# Altium footprint library 7Robot.PcbLib: 67 footprints (part 4 of 5)
Each footprint in its own frame and in the unit in brackets; x right, y up, seen from the top. Pads: shape width x height; smd on the part's side, far side on the other; paste and mask are expansions set on the pad; w line width, h text height; cw(c..) or ccw(c..) is an arc to the next point about the centre after c.
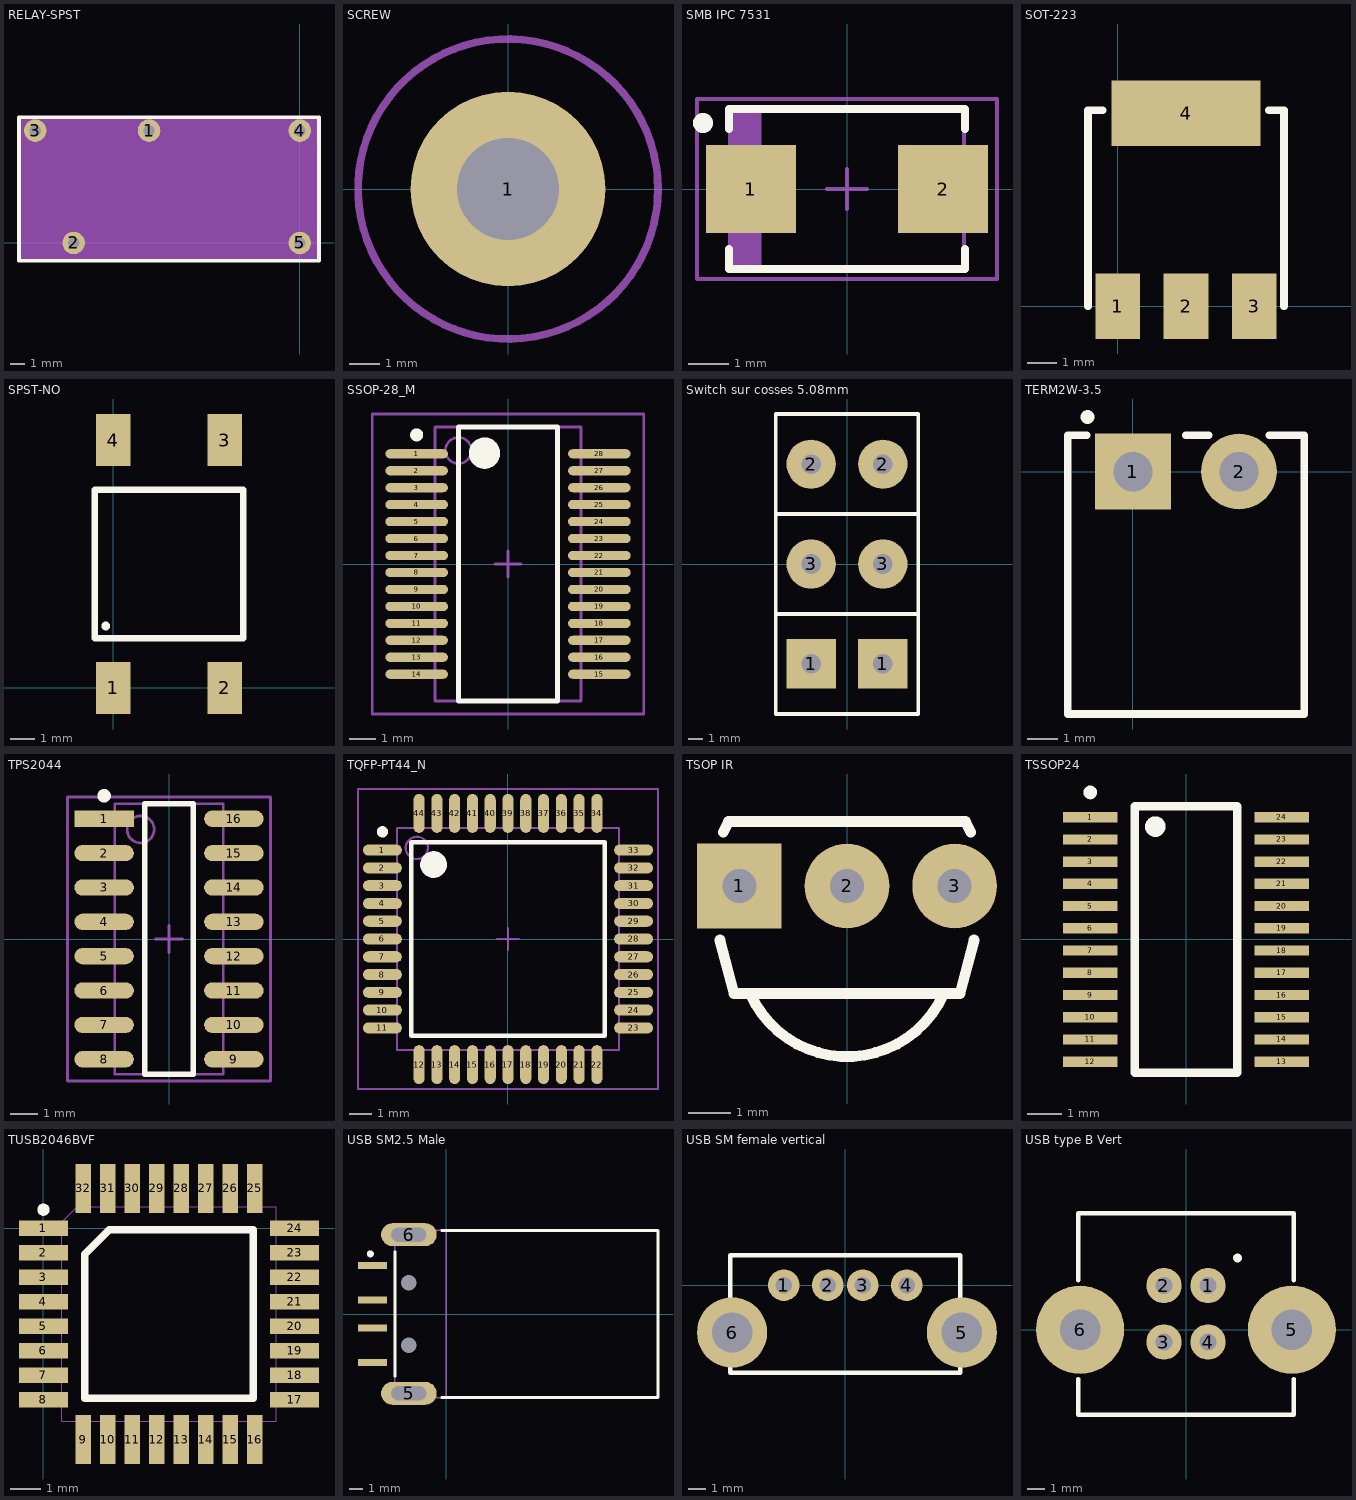
[diagram p3: the footprints below, top view; thin cyan lines are the x and y axes]

## RELAY-SPST [mil]
height 590.55
pads (5):
  round 60 hole 30: 1(-401.57,299.21) 2(-602.36,0) 3(-704.72,299.21) 4(0,299.21) 5(0,0)
Top Overlay:
  lines w10: -748.03,-47.24 51.18,-47.24 51.18,334.65 -748.03,334.65 -748.03,-47.24
Mechanical 1:
  rectangle: -748.03,-47.24 51.18,334.65

## SCREW [mm] "Mounting Hole M3"
height 10
pads (1):
  round 6.5 hole 3.4: 1(0,0)
Mechanical 1:
  circle w0.254: c0,0 r5
3D body: height -0.8, standoff -3.8, extent -2.886,-2.523 2.886,2.524
3D body: height 10, standoff -8.18, extent -2.886,-2.523 2.887,2.524

## SMB IPC 7531 [mm] "Molded Diode, 2-Leads, Body 5,8x3,6mm, IPC Medium Density"
height 2.45
pads (2):
  rect 2.25x2.2 smd: 1(-2.4,0) 2(2.4,0)
Top Overlay:
  circle w0.25: c-3.6,1.65 r0.125
  lines w0.2: -2.95,-1.5 -2.95,-2 2.95,-2 2.95,-1.5 ; -2.95,1.5 -2.95,2 2.95,2 2.95,1.5
Mechanical 13:
  rectangle: -2.92,-1.975 -2.135,1.975
  lines w0.1: -2.92,-1.975 -2.92,1.975 2.92,1.975 2.92,-1.975 -2.92,-1.975
Mechanical 15:
  lines w0.1: -0.5,0 0.5,0 ; 0,-0.5 0,0.5 ; -3.75,-2.25 -3.75,2.25 3.75,2.25 3.75,-2.25 -3.75,-2.25
3D body: height 2.45, standoff 0, extent -2.92,-1.975 2.92,1.975

## SOT-223 [mm] "Surface mounted, 4 pin package"
pads (4):
  rect 1.5x2.2 smd: 1(0,0) 2(2.3,0) 3(4.6,0)
  rect 5x2.2 smd: 4(2.3,6.5)
Top Overlay:
  lines w0.254: -1,0 -1,6.604 -0.508,6.604 ; 5.08,6.604 5.6,6.604 5.6,0
3D body: height 1.64, standoff -0.01, extent -0.95,-0.198 5.55,6.802

## SPST-NO [mm] "Tactile Switch SPST-NO 6x6mm"
height 6
pads (4):
  rect 1.4x2.1 smd: 1(0,0) 2(4.5,0) 3(4.5,10) 4(0,10)
Top Overlay:
  circle w0.254: c-0.3,2.5 r0.05
  lines w0.254: -0.75,2 5.25,2 5.25,8 -0.75,8 -0.75,2
3D body: height 5, standoff -0.05, extent -0.75,0.925 5.25,9.075

## SSOP-28_M [mm] "SOP, 28-Leads, Body 10.2x5.3mm, Pitch 0.65mm, IPC Low Density"
height 2
pads (28):
  oval 2.4x0.35 smd: 1(-3.5,4.225) 2(-3.5,3.575) 3(-3.5,2.925) 4(-3.5,2.275) 5(-3.5,1.625) 6(-3.5,0.975) 7(-3.5,0.325) 8(-3.5,-0.325) 9(-3.5,-0.975) 10(-3.5,-1.625) 11(-3.5,-2.275) 12(-3.5,-2.925) 13(-3.5,-3.575) 14(-3.5,-4.225) 15(3.5,-4.225) 16(3.5,-3.575) 17(3.5,-2.925) 18(3.5,-2.275) 19(3.5,-1.625) 20(3.5,-0.975) 21(3.5,-0.325) 22(3.5,0.325) 23(3.5,0.975) 24(3.5,1.625) 25(3.5,2.275) 26(3.5,2.925) 27(3.5,3.575) 28(3.5,4.225)
Top Overlay:
  circle w0.25: c-3.5,4.95 r0.125
  circle w0.6: c-0.9,4.25 r0.3
  lines w0.2: -1.9,-5.25 -1.9,5.25 1.9,5.25 1.9,-5.25 -1.9,-5.25
Mechanical 13:
  circle w0.1: c-1.9,4.35 r0.5
  lines w0.1: -2.8,-5.25 -2.8,5.25 2.8,5.25 2.8,-5.25 -2.8,-5.25
Mechanical 15:
  lines w0.1: -0.5,0 0.5,0 ; 0,-0.5 0,0.5 ; -5.2,-5.75 -5.2,5.75 5.2,5.75 5.2,-5.75 -5.2,-5.75
3D body: height 1.98, standoff -0.02, extent -3.906,-5.1 3.906,5.1

## Switch sur cosses 5.08mm [mm] "Crimp Faston CI 5.08mm model : AMP - 1217080-1"
pads (6):
  rect 3.5x3.5 hole 1.4: 1(-2.55,-7.1) 1(2.55,-7.1)
  round 3.5 hole 1.4: 2(-2.55,7.1) 2(2.55,7.1) 3(-2.55,0) 3(2.55,0)
Top Overlay:
  lines w0.254: -5.08,-3.556 5.08,-3.556 ; -5.08,3.556 5.08,3.556 ; -5.08,-10.668 5.08,-10.668 5.08,10.668 -5.08,10.668 -5.08,-10.668
3D body: height 8.38, standoff -11.62, extent -3.8,5.25 3.6,9.45
3D body: height 8.38, standoff -11.62, extent -3.85,-1.75 3.55,2.45
3D body: height 8.38, standoff -11.62, extent -3.7,-8.9 3.7,-4.7
3D body: height 29.34, standoff 1.4, extent -11.5,-11 11.5,12

## TERM2W-3.5 [mm] "Horizontal Terminal Block, 2 ways, 3.5mm; Model 20.155MH/2"
height 7
pads (2):
  rect 2.5x2.5 hole 1.3: 1(0,0)
  round 2.5 hole 1.3: 2(3.5,0)
Top Overlay:
  circle w0.254: c-1.5,1.8 r0.1
  lines w0.254: -1.524,1.2 -2.15,1.2 -2.15,-8 5.65,-8 5.65,1.2 4.5,1.2 ; 1.75,1.2 2.5,1.2
3D body: height 7.25, standoff -3.4, extent -2.45,-8 5.95,1.2

## TPS2044 [mm] "Power distribution USB"
height 1.75
pads (16):
  rect 2.2x0.6 smd: 1(-2.4,4.445)
  oval 2.2x0.6 smd: 2(-2.4,3.175) 3(-2.4,1.905) 4(-2.4,0.635) 5(-2.4,-0.635) 6(-2.4,-1.905) 7(-2.4,-3.175) 8(-2.4,-4.445) 9(2.4,-4.445) 10(2.4,-3.175) 11(2.4,-1.905) 12(2.4,-0.635) 13(2.4,0.635) 14(2.4,1.905) 15(2.4,3.175) 16(2.4,4.445)
Top Overlay:
  circle w0.25: c-2.4,5.295 r0.125
  lines w0.2: -0.9,-5 0.9,-5 0.9,5 -0.9,5 -0.9,-5
Mechanical 13:
  circle w0.1: c-1.05,4.05 r0.5
  lines w0.1: -2,-5 2,-5 2,5 -2,5 -2,-5
Mechanical 15:
  lines w0.1: -0.5,0 0.5,0 ; 0,-0.5 0,0.5 ; -3.75,-5.25 3.75,-5.25 3.75,5.25 -3.75,5.25 -3.75,-5.25
3D body: height 1.7, standoff 0, extent -3,-5.1 3,5.1

## TQFP-PT44_N [mm] "Thin QFP, 44-Leads, Body 10x10mm, Pitch 0.8mm, IPC Medium Density"
height 1.2
pads (44):
  oval 1.75x0.5 smd: 1(-5.65,4) 2(-5.65,3.2) 3(-5.65,2.4) 4(-5.65,1.6) 5(-5.65,0.8) 6(-5.65,0) 7(-5.65,-0.8) 8(-5.65,-1.6) 9(-5.65,-2.4) 10(-5.65,-3.2) 11(-5.65,-4) 23(5.65,-4) 24(5.65,-3.2) 25(5.65,-2.4) 26(5.65,-1.6) 27(5.65,-0.8) 28(5.65,0) 29(5.65,0.8) 30(5.65,1.6) 31(5.65,2.4) 32(5.65,3.2) 33(5.65,4)
  oval 0.5x1.75 smd: 12(-4,-5.65) 13(-3.2,-5.65) 14(-2.4,-5.65) 15(-1.6,-5.65) 16(-0.8,-5.65) 17(0,-5.65) 18(0.8,-5.65) 19(1.6,-5.65) 20(2.4,-5.65) 21(3.2,-5.65) 22(4,-5.65) 34(4,5.65) 35(3.2,5.65) 36(2.4,5.65) 37(1.6,5.65) 38(0.8,5.65) 39(0,5.65) 40(-0.8,5.65) 41(-1.6,5.65) 42(-2.4,5.65) 43(-3.2,5.65) 44(-4,5.65)
Top Overlay:
  circle w0.25: c-5.65,4.825 r0.125
  circle w0.6: c-3.35,3.35 r0.3
  lines w0.2: -4.35,-4.35 -4.35,4.35 4.35,4.35 4.35,-4.35 -4.35,-4.35
Mechanical 13:
  circle w0.1: c-4.1,4.1 r0.5
  lines w0.1: -5,-5 -5,5 5,5 5,-5 -5,-5
Mechanical 15:
  lines w0.1: -0.5,0 0.5,0 ; 0,-0.5 0,0.5 ; -6.75,-6.75 -6.75,6.75 6.75,6.75 6.75,-6.75 -6.75,-6.75
3D body: height 1.05, standoff -0.01, extent -6,-6 6,6

## TSOP IR [mm] "TSOP IR Receiver, Vishay"
height 10
pads (3):
  rect 2x2 hole 0.8: 1(-2.54,-35.924)
  round 2 hole 0.8: 2(0,-35.924) 3(2.54,-35.924)
Top Overlay:
  lines w0.254: -3,-37.2 -2.667,-38.464 2.667,-38.464 3,-37.2 ; -2.921,-34.654 -2.794,-34.4 2.794,-34.4 2.921,-34.654 ; -2.286,-38.464 ccw(c0,-37.448) 2.286,-38.464
3D body: height 8.45, standoff -2.5, extent -3,-40 3,-34.4

## TSSOP24 [mil] "TSSOP, 24-Leads, Body 6.5x4.4mm, Pitch 0.5mm; SN74CBTD3861"
pads (24):
  rect 63x11.8 smd: 1(-110.2,140.7) 2(-110.2,115.2) 3(-110.2,89.6) 4(-110.2,64) 5(-110.2,38.4) 6(-110.2,12.8) 7(-110.2,-12.8) 8(-110.2,-38.4) 9(-110.2,-64) 10(-110.2,-89.6) 11(-110.2,-115.2) 12(-110.2,-140.7) 13(110.2,-140.7) 14(110.2,-115.2) 15(110.2,-89.6) 16(110.2,-64) 17(110.2,-38.4) 18(110.2,-12.8) 19(110.2,12.8) 20(110.2,38.4) 21(110.2,64) 22(110.2,89.6) 23(110.2,115.2) 24(110.2,140.7)
Top Overlay:
  circle w15.75: c-35.43,129.92 r3.94
  circle w7.87: c-110.24,169.29 r3.94
  lines w10: -59.1,-153.54 -59.1,153.54 59.1,153.54 59.1,-153.54 -59.1,-153.54
3D body: height 41.34, standoff -1.97, extent -125.99,-155.51 125.98,155.51

## TUSB2046BVF [mil] "TI 4-Port USB Hub"
height 55.12
pads (32):
  rect 63x19.7 smd: 1(0,0) 2(0,-31.5) 3(0,-63) 4(0,-94.5) 5(0,-125.9) 6(0,-157.4) 7(0,-188.9) 8(0,-220.4) 17(322.8,-220.4) 18(322.8,-188.9) 19(322.8,-157.4) 20(322.8,-125.9) 21(322.8,-94.5) 22(322.8,-63) 23(322.8,-31.5) 24(322.8,0)
  rect 19.7x63 smd: 9(51.2,-271.6) 10(82.7,-271.6) 11(114.2,-271.6) 12(145.7,-271.6) 13(177.1,-271.6) 14(208.6,-271.6) 15(240.1,-271.6) 16(271.6,-271.6) 25(271.6,51.2) 26(240.1,51.2) 27(208.6,51.2) 28(177.1,51.2) 29(145.7,51.2) 30(114.2,51.2) 31(82.7,51.2) 32(51.2,51.2)
Top Overlay:
  circle w7.87: c0,23.94 r3.94
  lines w10: 53.1,-218.5 269.7,-218.5 269.7,-1.9 84.7,-1.9 53.1,-33.5 53.1,-218.5
Mechanical 1:
  lines w0.4: 23.6,-248 299.2,-248 299.2,27.6 43.3,27.6 23.6,7.9 23.6,-248
3D body: height 59.06, standoff 0.79, extent -15.76,-287.36 338.56,66.96

## USB SM2.5 Male [mm] "USB/SM2.5-4H4; Male USB Connector; USB1.1, Type A, SM; 4 Position; Right Angle"
height 4.5
pads (8):
  rect 2.1x0.5 smd: 1(-5.3,3.5) 2(-5.3,1) 3(-5.3,-1) 4(-5.3,-3.5)
  oval 4x1.65 hole 1 slot 2.5 at 0 deg: 5(-2.7,-5.7) 6(-2.7,5.7)
  round 0.8 hole 1.1 unplated: MH1(-2.7,-2.25) MH2(-2.7,2.25)
Top Overlay:
  circle w0.25: c-5.459,4.318 r0.125
  lines w0.2: -3.7,-4.475 -3.7,4.475 ; -0.33,-6 15.2,-6 15.2,6 -0.33,6
Mechanical 1:
  lines w0.1: 0,-6 0,6
  text "PCB Edge" at 0.473,-5.173 h0.25
Mechanical 13:
  lines w0.1: -3.7,-6 -3.7,6 15.2,6 15.2,-6 -3.7,-6
3D body: height 4.5, standoff 0, extent -3.5,-6 14.83,6

## USB SM female vertical [mm] "USB SM female vertical"
height 13.6
pads (6):
  round 1.8 hole 0.95: 1(-3.5,0) 2(-1,0) 3(1,0) 4(3.5,0)
  round 4 hole 2.3: 5(6.65,-2.7) 6(-6.45,-2.7)
Top Overlay:
  lines w0.254: -6.55,-4.99 6.55,-4.99 6.55,1.7 -6.55,1.7 -6.55,-4.99
3D body: height 13.75, standoff -4.05, extent -7.992,-4.99 7.992,2.65

## USB type B Vert [mm] "USB 2.0 chassis socket type B, upright version, for printed circuit boards ; Lumberg 2411 01  or  MC32597"
height 16
pads (6):
  round 2 hole 0.95: 1(1.25,2.5) 2(-1.25,2.5) 3(-1.25,-0.7) 4(1.25,-0.7)
  round 5 hole 2.3: 5(6,0) 6(-6,0)
Top Overlay:
  circle w0.25: c2.923,4.064 r0.125
  lines w0.254: -6.096,-2.794 -6.096,-4.826 6.096,-4.826 6.096,-2.794 ; -6.096,2.794 -6.096,6.604 6.096,6.604 6.096,2.794
3D body: height 16, standoff -3.8, extent -7.146,-4.75 7.146,6.55